# Altium schematic symbol library MCU_Microchip_ATmega.SchLib: 440 symbols (part 7 of 9)
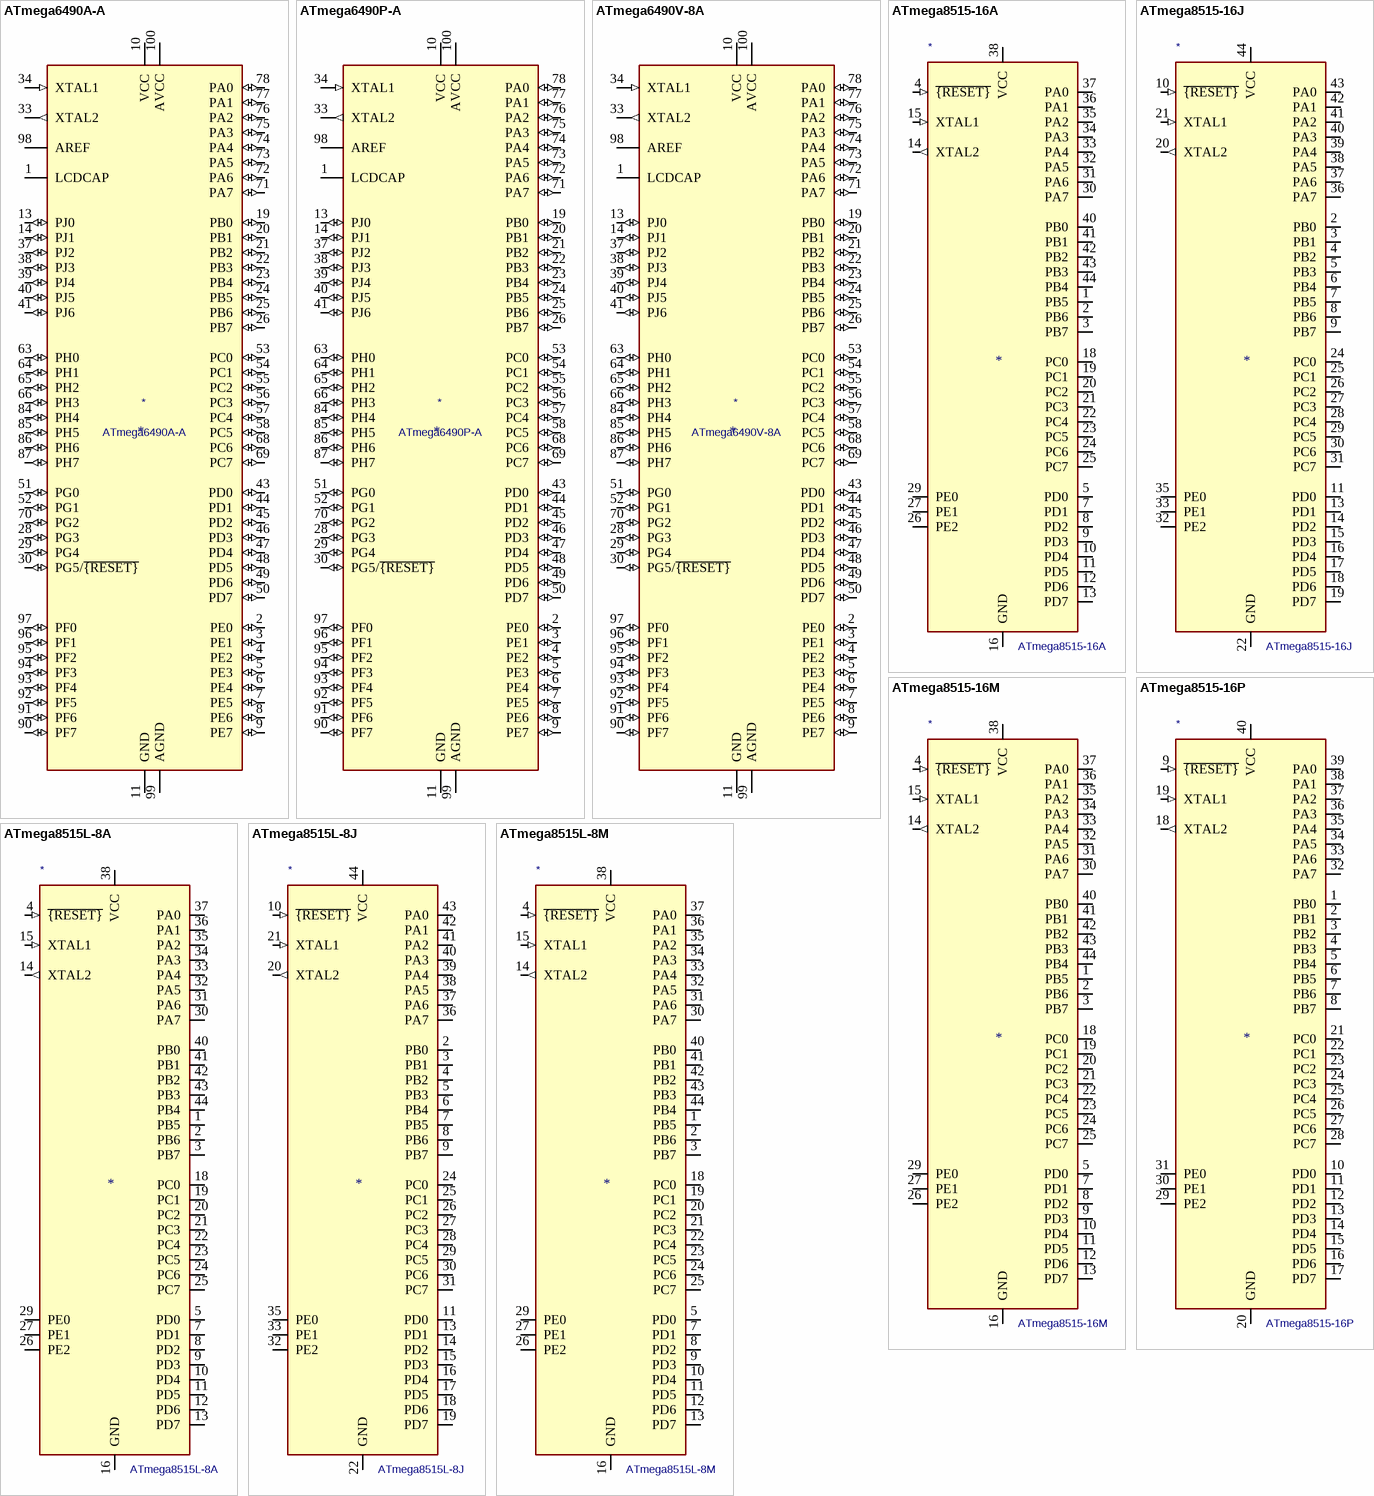
[diagram p46: symbols ATmega6490A-A to ATmega8515L-8M]

## ATmega6490A-A
designator *  value ATmega6490A-A
ki_keywords: AVR 8bit Microcontroller MegaAVR; ki_description: 20MHz, 64kB Flash, 4kB SRAM, 2kB EEPROM, JTAG, TQFP-100; ki_fp_filters: TQFP*14x14mm*P0.5mm*; Footprint: Package_QFP:TQFP-100_14x14mm_P0.5mm; Supplier: http://ww1.microchip.com/downloads/en/DeviceDoc/atmel-8284-8-bit-avr-microcontroller-atmega169a_pa_329a_pa_3290a_pa_649a_p_6490a_p_datasheet.pdf
footprint TQFP-100_14x14mm_P0.5mm
pins: 1 LCDCAP, 2 PE0 (io), 3 PE1 (io), 4 PE2 (io), 5 PE3 (io), 6 PE4 (io), 7 PE5 (io), 8 PE6 (io), 9 PE7 (io), 10 VCC (power), 11 GND (power), 12 NC (in) hidden, 13 PJ0 (io), 14 PJ1 (io), 15 NC (in) hidden, 16 NC (in) hidden, 17 NC (in) hidden, 18 NC (in) hidden, 19 PB0 (io), 20 PB1 (io), 21 PB2 (io), 22 PB3 (io), 23 PB4 (io), 24 PB5 (io), 25 PB6 (io), 26 PB7 (io), 27 NC (in) hidden, 28 PG3 (io), 29 PG4 (io), 30 PG5/~{{RESET}} (io), 31 VCC hidden, 32 GND hidden, 33 XTAL2 (out), 34 XTAL1 (in), 35 NC (in) hidden, 36 NC (in) hidden, 37 PJ2 (io), 38 PJ3 (io), 39 PJ4 (io), 40 PJ5 (io), 41 PJ6 (io), 42 NC (in) hidden, 43 PD0 (io), 44 PD1 (io), 45 PD2 (io), 46 PD3 (io), 47 PD4 (io), 48 PD5 (io), 49 PD6 (io), 50 PD7 (io), 51 PG0 (io), 52 PG1 (io), 53 PC0 (io), 54 PC1 (io), 55 PC2 (io), 56 PC3 (io), 57 PC4 (io), 58 PC5 (io), 59 NC (in) hidden, 60 NC (in) hidden, 61 NC (in) hidden, 62 NC (in) hidden, 63 PH0 (io), 64 PH1 (io), 65 PH2 (io), 66 PH3 (io), 67 NC (in) hidden, 68 PC6 (io), 69 PC7 (io), 70 PG2 (io), 71 PA7 (io), 72 PA6 (io), 73 PA5 (io), 74 PA4 (io), 75 PA3 (io), 76 PA2 (io), 77 PA1 (io), 78 PA0 (io), 79 NC (in) hidden, 80 VCC hidden, 81 GND hidden, 82 NC (in) hidden, 83 NC (in) hidden, 84 PH4 (io), 85 PH5 (io), 86 PH6 (io), 87 PH7 (io), 88 NC (in) hidden, 89 NC (in) hidden, 90 PF7 (io), 91 PF6 (io), 92 PF5 (io), 93 PF4 (io), 94 PF3 (io), 95 PF2 (io), 96 PF1 (io), 97 PF0 (io), 98 AREF, 99 AGND (power), 100 AVCC (power)

## ATmega6490P-A
designator *  value ATmega6490P-A
ki_keywords: AVR 8bit Microcontroller MegaAVR; ki_description: 20MHz, 64kB Flash, 4kB SRAM, 2kB EEPROM, JTAG, TQFP-100; ki_fp_filters: TQFP*14x14mm*P0.5mm*; Footprint: Package_QFP:TQFP-100_14x14mm_P0.5mm; Supplier: http://ww1.microchip.com/downloads/en/DeviceDoc/atmel-8284-8-bit-avr-microcontroller-atmega169a_pa_329a_pa_3290a_pa_649a_p_6490a_p_datasheet.pdf
footprint TQFP-100_14x14mm_P0.5mm
pins: 1 LCDCAP, 2 PE0 (io), 3 PE1 (io), 4 PE2 (io), 5 PE3 (io), 6 PE4 (io), 7 PE5 (io), 8 PE6 (io), 9 PE7 (io), 10 VCC (power), 11 GND (power), 12 NC (in) hidden, 13 PJ0 (io), 14 PJ1 (io), 15 NC (in) hidden, 16 NC (in) hidden, 17 NC (in) hidden, 18 NC (in) hidden, 19 PB0 (io), 20 PB1 (io), 21 PB2 (io), 22 PB3 (io), 23 PB4 (io), 24 PB5 (io), 25 PB6 (io), 26 PB7 (io), 27 NC (in) hidden, 28 PG3 (io), 29 PG4 (io), 30 PG5/~{{RESET}} (io), 31 VCC hidden, 32 GND hidden, 33 XTAL2 (out), 34 XTAL1 (in), 35 NC (in) hidden, 36 NC (in) hidden, 37 PJ2 (io), 38 PJ3 (io), 39 PJ4 (io), 40 PJ5 (io), 41 PJ6 (io), 42 NC (in) hidden, 43 PD0 (io), 44 PD1 (io), 45 PD2 (io), 46 PD3 (io), 47 PD4 (io), 48 PD5 (io), 49 PD6 (io), 50 PD7 (io), 51 PG0 (io), 52 PG1 (io), 53 PC0 (io), 54 PC1 (io), 55 PC2 (io), 56 PC3 (io), 57 PC4 (io), 58 PC5 (io), 59 NC (in) hidden, 60 NC (in) hidden, 61 NC (in) hidden, 62 NC (in) hidden, 63 PH0 (io), 64 PH1 (io), 65 PH2 (io), 66 PH3 (io), 67 NC (in) hidden, 68 PC6 (io), 69 PC7 (io), 70 PG2 (io), 71 PA7 (io), 72 PA6 (io), 73 PA5 (io), 74 PA4 (io), 75 PA3 (io), 76 PA2 (io), 77 PA1 (io), 78 PA0 (io), 79 NC (in) hidden, 80 VCC hidden, 81 GND hidden, 82 NC (in) hidden, 83 NC (in) hidden, 84 PH4 (io), 85 PH5 (io), 86 PH6 (io), 87 PH7 (io), 88 NC (in) hidden, 89 NC (in) hidden, 90 PF7 (io), 91 PF6 (io), 92 PF5 (io), 93 PF4 (io), 94 PF3 (io), 95 PF2 (io), 96 PF1 (io), 97 PF0 (io), 98 AREF, 99 AGND (power), 100 AVCC (power)

## ATmega6490V-8A
designator *  value ATmega6490V-8A
ki_keywords: AVR 8bit Microcontroller MegaAVR; ki_description: 8MHz, 64kB Flash, 4kB SRAM, 2kB EEPROM, JTAG, TQFP-100; ki_fp_filters: TQFP*14x14mm*P0.5mm*; Footprint: Package_QFP:TQFP-100_14x14mm_P0.5mm; Supplier: http://ww1.microchip.com/downloads/en/DeviceDoc/doc2552.pdf
footprint TQFP-100_14x14mm_P0.5mm
pins: 1 LCDCAP, 2 PE0 (io), 3 PE1 (io), 4 PE2 (io), 5 PE3 (io), 6 PE4 (io), 7 PE5 (io), 8 PE6 (io), 9 PE7 (io), 10 VCC (power), 11 GND (power), 12 NC (in) hidden, 13 PJ0 (io), 14 PJ1 (io), 15 NC (in) hidden, 16 NC (in) hidden, 17 NC (in) hidden, 18 NC (in) hidden, 19 PB0 (io), 20 PB1 (io), 21 PB2 (io), 22 PB3 (io), 23 PB4 (io), 24 PB5 (io), 25 PB6 (io), 26 PB7 (io), 27 NC (in) hidden, 28 PG3 (io), 29 PG4 (io), 30 PG5/~{{RESET}} (io), 31 VCC hidden, 32 GND hidden, 33 XTAL2 (out), 34 XTAL1 (in), 35 NC (in) hidden, 36 NC (in) hidden, 37 PJ2 (io), 38 PJ3 (io), 39 PJ4 (io), 40 PJ5 (io), 41 PJ6 (io), 42 NC (in) hidden, 43 PD0 (io), 44 PD1 (io), 45 PD2 (io), 46 PD3 (io), 47 PD4 (io), 48 PD5 (io), 49 PD6 (io), 50 PD7 (io), 51 PG0 (io), 52 PG1 (io), 53 PC0 (io), 54 PC1 (io), 55 PC2 (io), 56 PC3 (io), 57 PC4 (io), 58 PC5 (io), 59 NC (in) hidden, 60 NC (in) hidden, 61 NC (in) hidden, 62 NC (in) hidden, 63 PH0 (io), 64 PH1 (io), 65 PH2 (io), 66 PH3 (io), 67 NC (in) hidden, 68 PC6 (io), 69 PC7 (io), 70 PG2 (io), 71 PA7 (io), 72 PA6 (io), 73 PA5 (io), 74 PA4 (io), 75 PA3 (io), 76 PA2 (io), 77 PA1 (io), 78 PA0 (io), 79 NC (in) hidden, 80 VCC hidden, 81 GND hidden, 82 NC (in) hidden, 83 NC (in) hidden, 84 PH4 (io), 85 PH5 (io), 86 PH6 (io), 87 PH7 (io), 88 NC (in) hidden, 89 NC (in) hidden, 90 PF7 (io), 91 PF6 (io), 92 PF5 (io), 93 PF4 (io), 94 PF3 (io), 95 PF2 (io), 96 PF1 (io), 97 PF0 (io), 98 AREF, 99 AGND (power), 100 AVCC (power)

## ATmega8515-16A
designator *  value ATmega8515-16A
ki_keywords: AVR 8bit Microcontroller MegaAVR; ki_description: 16MHz, 8kB Flash, 512B SRAM, 512B EEPROM, TQFP-44; ki_fp_filters: TQFP*10x10mm*P0.8mm*; Footprint: Package_QFP:TQFP-44_10x10mm_P0.8mm; Supplier: http://ww1.microchip.com/downloads/en/DeviceDoc/doc2512.pdf
footprint TQFP-44_10x10mm_P0.8mm
pins: 1 PB5 (io), 2 PB6 (io), 3 PB7 (io), 4 ~{{RESET}} (in), 5 PD0 (io), 6 NC (in) hidden, 7 PD1 (io), 8 PD2 (io), 9 PD3 (io), 10 PD4 (io), 11 PD5 (io), 12 PD6 (io), 13 PD7 (io), 14 XTAL2 (out), 15 XTAL1 (in), 16 GND (power), 17 NC (in) hidden, 18 PC0 (io), 19 PC1 (io), 20 PC2 (io), 21 PC3 (io), 22 PC4 (io), 23 PC5 (io), 24 PC6 (io), 25 PC7 (io), 26 PE2 (io), 27 PE1 (io), 28 NC (in) hidden, 29 PE0 (io), 30 PA7 (io), 31 PA6 (io), 32 PA5 (io), 33 PA4 (io), 34 PA3 (io), 35 PA2 (io), 36 PA1 (io), 37 PA0 (io), 38 VCC (power), 39 NC (in) hidden, 40 PB0 (io), 41 PB1 (io), 42 PB2 (io), 43 PB3 (io), 44 PB4 (io)

## ATmega8515-16J
designator *  value ATmega8515-16J
ki_keywords: AVR 8bit Microcontroller MegaAVR; ki_description: 16MHz, 8kB Flash, 512B SRAM, 512B EEPROM, PLCC-44; ki_fp_filters: PLCC*; Footprint: Package_LCC:PLCC-44; Supplier: http://ww1.microchip.com/downloads/en/DeviceDoc/doc2512.pdf
footprint PLCC-44
pins: 1 NC (in) hidden, 2 PB0 (io), 3 PB1 (io), 4 PB2 (io), 5 PB3 (io), 6 PB4 (io), 7 PB5 (io), 8 PB6 (io), 9 PB7 (io), 10 ~{{RESET}} (in), 11 PD0 (io), 12 NC (in) hidden, 13 PD1 (io), 14 PD2 (io), 15 PD3 (io), 16 PD4 (io), 17 PD5 (io), 18 PD6 (io), 19 PD7 (io), 20 XTAL2 (out), 21 XTAL1 (in), 22 GND (power), 23 NC (in) hidden, 24 PC0 (io), 25 PC1 (io), 26 PC2 (io), 27 PC3 (io), 28 PC4 (io), 29 PC5 (io), 30 PC6 (io), 31 PC7 (io), 32 PE2 (io), 33 PE1 (io), 34 NC (in) hidden, 35 PE0 (io), 36 PA7 (io), 37 PA6 (io), 38 PA5 (io), 39 PA4 (io), 40 PA3 (io), 41 PA2 (io), 42 PA1 (io), 43 PA0 (io), 44 VCC (power)

## ATmega8515-16M
designator *  value ATmega8515-16M
ki_keywords: AVR 8bit Microcontroller MegaAVR; ki_description: 16MHz, 8kB Flash, 512B SRAM, 512B EEPROM, QFN-44; ki_fp_filters: QFN*1EP*7x7mm*P0.5mm*; Footprint: Package_DFN_QFN:QFN-44-1EP_7x7mm_P0.5mm_EP5.2x5.2mm; Supplier: http://ww1.microchip.com/downloads/en/DeviceDoc/doc2512.pdf
footprint QFN-44-1EP_7x7mm_P0.5mm_EP5.2x5.2mm
pins: 1 PB5 (io), 2 PB6 (io), 3 PB7 (io), 4 ~{{RESET}} (in), 5 PD0 (io), 6 NC (in) hidden, 7 PD1 (io), 8 PD2 (io), 9 PD3 (io), 10 PD4 (io), 11 PD5 (io), 12 PD6 (io), 13 PD7 (io), 14 XTAL2 (out), 15 XTAL1 (in), 16 GND (power), 17 NC (in) hidden, 18 PC0 (io), 19 PC1 (io), 20 PC2 (io), 21 PC3 (io), 22 PC4 (io), 23 PC5 (io), 24 PC6 (io), 25 PC7 (io), 26 PE2 (io), 27 PE1 (io), 28 NC (in) hidden, 29 PE0 (io), 30 PA7 (io), 31 PA6 (io), 32 PA5 (io), 33 PA4 (io), 34 PA3 (io), 35 PA2 (io), 36 PA1 (io), 37 PA0 (io), 38 VCC (power), 39 NC (in) hidden, 40 PB0 (io), 41 PB1 (io), 42 PB2 (io), 43 PB3 (io), 44 PB4 (io), 45 GND hidden

## ATmega8515-16P
designator *  value ATmega8515-16P
ki_keywords: AVR 8bit Microcontroller MegaAVR; ki_description: 16MHz, 8kB Flash, 512B SRAM, 512B EEPROM, DIP-40; ki_fp_filters: DIP*W15.24mm*; Footprint: Package_DIP:DIP-40_W15.24mm; Supplier: http://ww1.microchip.com/downloads/en/DeviceDoc/doc2512.pdf
footprint DIP-40_W15.24mm
pins: 1 PB0 (io), 2 PB1 (io), 3 PB2 (io), 4 PB3 (io), 5 PB4 (io), 6 PB5 (io), 7 PB6 (io), 8 PB7 (io), 9 ~{{RESET}} (in), 10 PD0 (io), 11 PD1 (io), 12 PD2 (io), 13 PD3 (io), 14 PD4 (io), 15 PD5 (io), 16 PD6 (io), 17 PD7 (io), 18 XTAL2 (out), 19 XTAL1 (in), 20 GND (power), 21 PC0 (io), 22 PC1 (io), 23 PC2 (io), 24 PC3 (io), 25 PC4 (io), 26 PC5 (io), 27 PC6 (io), 28 PC7 (io), 29 PE2 (io), 30 PE1 (io), 31 PE0 (io), 32 PA7 (io), 33 PA6 (io), 34 PA5 (io), 35 PA4 (io), 36 PA3 (io), 37 PA2 (io), 38 PA1 (io), 39 PA0 (io), 40 VCC (power)

## ATmega8515L-8A
designator *  value ATmega8515L-8A
ki_keywords: AVR 8bit Microcontroller MegaAVR; ki_description: 8MHz, 8kB Flash, 512B SRAM, 512B EEPROM, TQFP-44; ki_fp_filters: TQFP*10x10mm*P0.8mm*; Footprint: Package_QFP:TQFP-44_10x10mm_P0.8mm; Supplier: http://ww1.microchip.com/downloads/en/DeviceDoc/doc2512.pdf
footprint TQFP-44_10x10mm_P0.8mm
pins: 1 PB5 (io), 2 PB6 (io), 3 PB7 (io), 4 ~{{RESET}} (in), 5 PD0 (io), 6 NC (in) hidden, 7 PD1 (io), 8 PD2 (io), 9 PD3 (io), 10 PD4 (io), 11 PD5 (io), 12 PD6 (io), 13 PD7 (io), 14 XTAL2 (out), 15 XTAL1 (in), 16 GND (power), 17 NC (in) hidden, 18 PC0 (io), 19 PC1 (io), 20 PC2 (io), 21 PC3 (io), 22 PC4 (io), 23 PC5 (io), 24 PC6 (io), 25 PC7 (io), 26 PE2 (io), 27 PE1 (io), 28 NC (in) hidden, 29 PE0 (io), 30 PA7 (io), 31 PA6 (io), 32 PA5 (io), 33 PA4 (io), 34 PA3 (io), 35 PA2 (io), 36 PA1 (io), 37 PA0 (io), 38 VCC (power), 39 NC (in) hidden, 40 PB0 (io), 41 PB1 (io), 42 PB2 (io), 43 PB3 (io), 44 PB4 (io)

## ATmega8515L-8J
designator *  value ATmega8515L-8J
ki_keywords: AVR 8bit Microcontroller MegaAVR; ki_description: 8MHz, 8kB Flash, 512B SRAM, 512B EEPROM, PLCC-44; ki_fp_filters: PLCC*; Footprint: Package_LCC:PLCC-44; Supplier: http://ww1.microchip.com/downloads/en/DeviceDoc/doc2512.pdf
footprint PLCC-44
pins: 1 NC (in) hidden, 2 PB0 (io), 3 PB1 (io), 4 PB2 (io), 5 PB3 (io), 6 PB4 (io), 7 PB5 (io), 8 PB6 (io), 9 PB7 (io), 10 ~{{RESET}} (in), 11 PD0 (io), 12 NC (in) hidden, 13 PD1 (io), 14 PD2 (io), 15 PD3 (io), 16 PD4 (io), 17 PD5 (io), 18 PD6 (io), 19 PD7 (io), 20 XTAL2 (out), 21 XTAL1 (in), 22 GND (power), 23 NC (in) hidden, 24 PC0 (io), 25 PC1 (io), 26 PC2 (io), 27 PC3 (io), 28 PC4 (io), 29 PC5 (io), 30 PC6 (io), 31 PC7 (io), 32 PE2 (io), 33 PE1 (io), 34 NC (in) hidden, 35 PE0 (io), 36 PA7 (io), 37 PA6 (io), 38 PA5 (io), 39 PA4 (io), 40 PA3 (io), 41 PA2 (io), 42 PA1 (io), 43 PA0 (io), 44 VCC (power)

## ATmega8515L-8M
designator *  value ATmega8515L-8M
ki_keywords: AVR 8bit Microcontroller MegaAVR; ki_description: 8MHz, 8kB Flash, 512B SRAM, 512B EEPROM, QFN-44; ki_fp_filters: QFN*1EP*7x7mm*P0.5mm*; Footprint: Package_DFN_QFN:QFN-44-1EP_7x7mm_P0.5mm_EP5.2x5.2mm; Supplier: http://ww1.microchip.com/downloads/en/DeviceDoc/doc2512.pdf
footprint QFN-44-1EP_7x7mm_P0.5mm_EP5.2x5.2mm
pins: 1 PB5 (io), 2 PB6 (io), 3 PB7 (io), 4 ~{{RESET}} (in), 5 PD0 (io), 6 NC (in) hidden, 7 PD1 (io), 8 PD2 (io), 9 PD3 (io), 10 PD4 (io), 11 PD5 (io), 12 PD6 (io), 13 PD7 (io), 14 XTAL2 (out), 15 XTAL1 (in), 16 GND (power), 17 NC (in) hidden, 18 PC0 (io), 19 PC1 (io), 20 PC2 (io), 21 PC3 (io), 22 PC4 (io), 23 PC5 (io), 24 PC6 (io), 25 PC7 (io), 26 PE2 (io), 27 PE1 (io), 28 NC (in) hidden, 29 PE0 (io), 30 PA7 (io), 31 PA6 (io), 32 PA5 (io), 33 PA4 (io), 34 PA3 (io), 35 PA2 (io), 36 PA1 (io), 37 PA0 (io), 38 VCC (power), 39 NC (in) hidden, 40 PB0 (io), 41 PB1 (io), 42 PB2 (io), 43 PB3 (io), 44 PB4 (io), 45 GND hidden

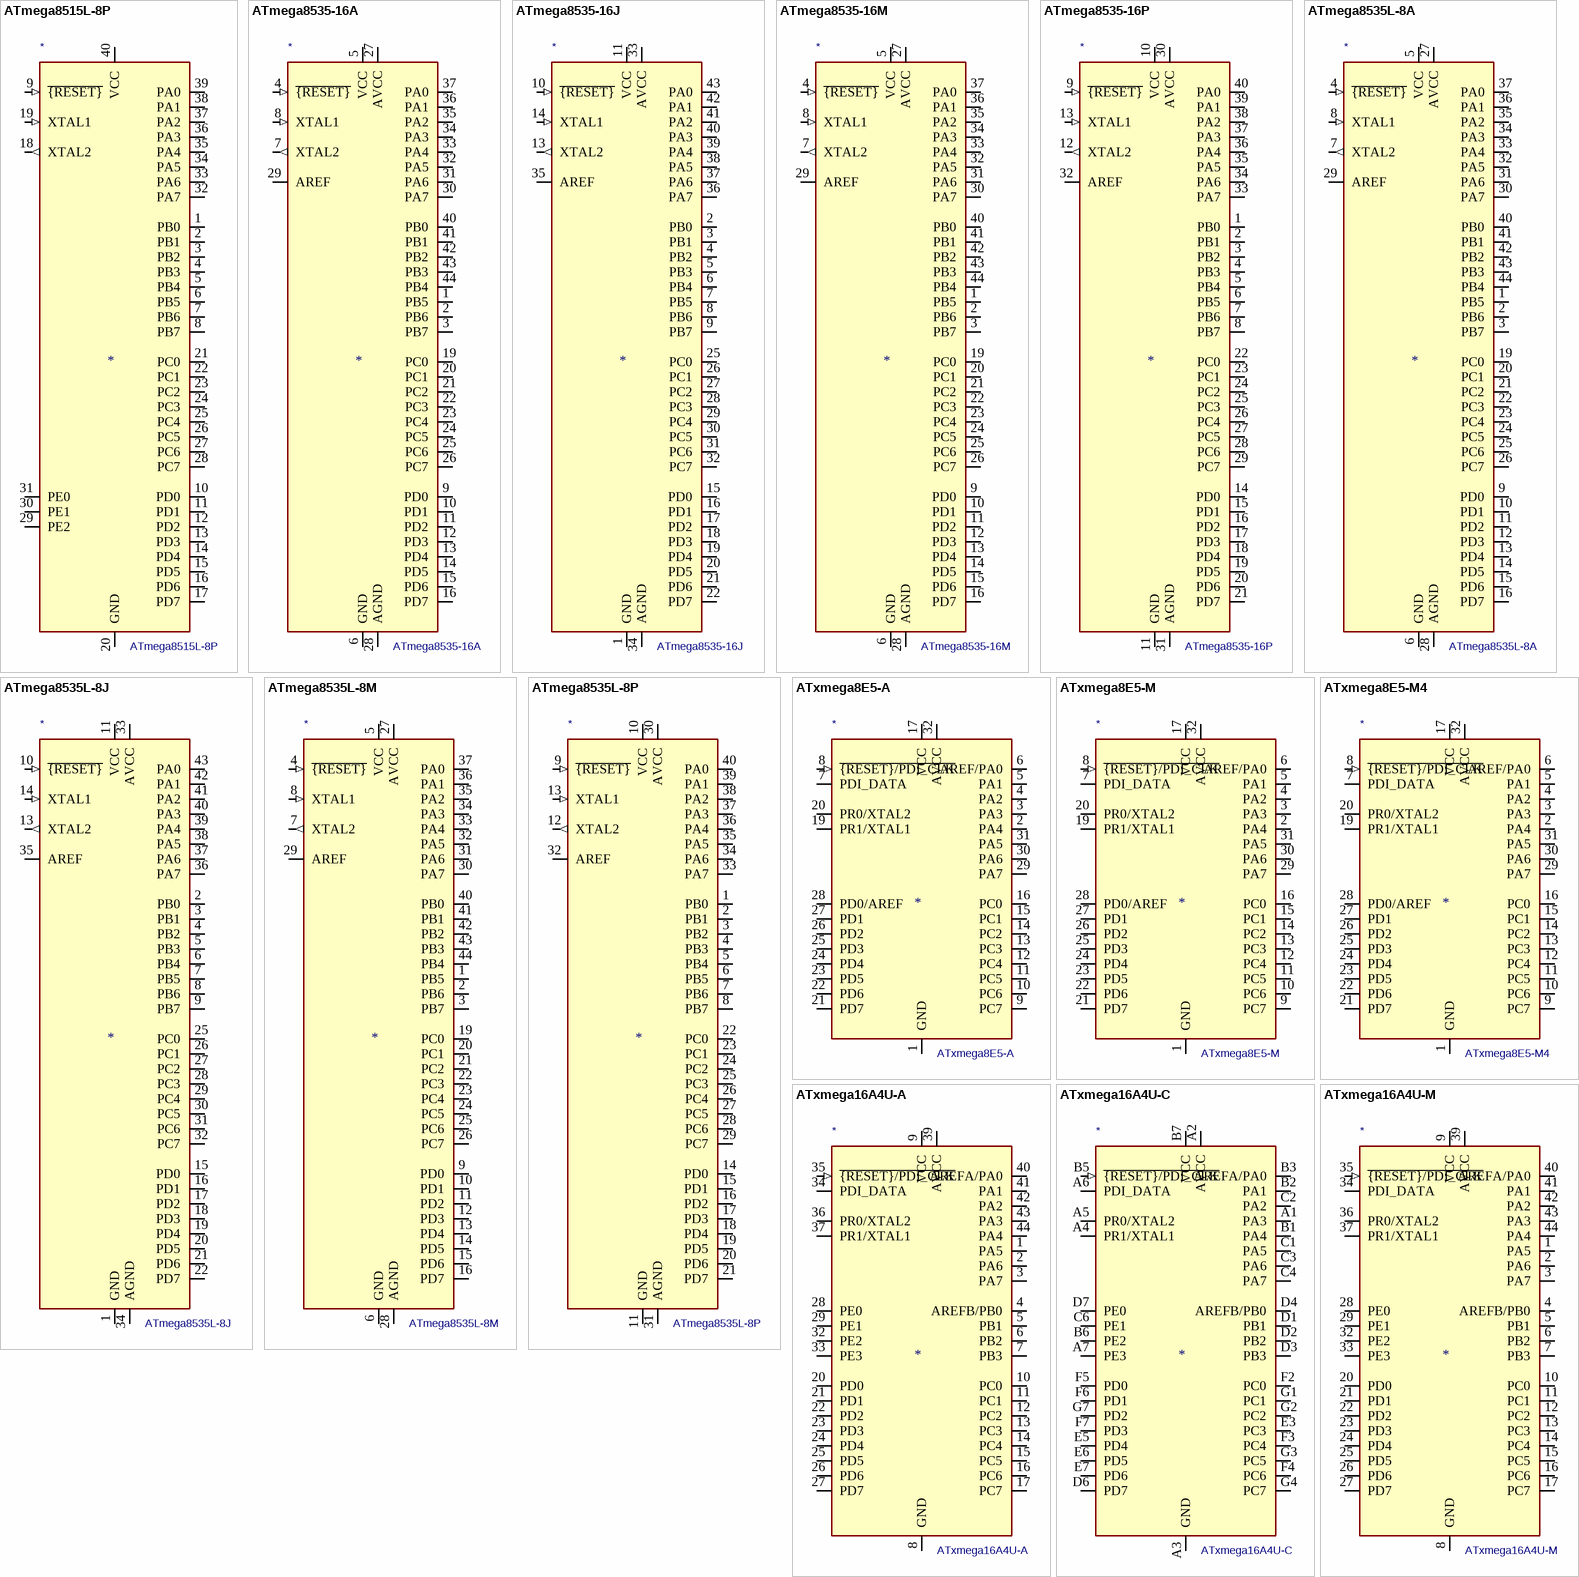
[diagram p30: symbols ATmega8515L-8P to ATxmega16A4U-M]

## ATmega8515L-8P
designator *  value ATmega8515L-8P
ki_keywords: AVR 8bit Microcontroller MegaAVR; ki_description: 8MHz, 8kB Flash, 512B SRAM, 512B EEPROM, DIP-40; ki_fp_filters: DIP*W15.24mm*; Footprint: Package_DIP:DIP-40_W15.24mm; Supplier: http://ww1.microchip.com/downloads/en/DeviceDoc/doc2512.pdf
footprint DIP-40_W15.24mm
pins: 1 PB0 (io), 2 PB1 (io), 3 PB2 (io), 4 PB3 (io), 5 PB4 (io), 6 PB5 (io), 7 PB6 (io), 8 PB7 (io), 9 ~{{RESET}} (in), 10 PD0 (io), 11 PD1 (io), 12 PD2 (io), 13 PD3 (io), 14 PD4 (io), 15 PD5 (io), 16 PD6 (io), 17 PD7 (io), 18 XTAL2 (out), 19 XTAL1 (in), 20 GND (power), 21 PC0 (io), 22 PC1 (io), 23 PC2 (io), 24 PC3 (io), 25 PC4 (io), 26 PC5 (io), 27 PC6 (io), 28 PC7 (io), 29 PE2 (io), 30 PE1 (io), 31 PE0 (io), 32 PA7 (io), 33 PA6 (io), 34 PA5 (io), 35 PA4 (io), 36 PA3 (io), 37 PA2 (io), 38 PA1 (io), 39 PA0 (io), 40 VCC (power)

## ATmega8535-16A
designator *  value ATmega8535-16A
ki_keywords: AVR 8bit Microcontroller MegaAVR; ki_description: 16MHz, 8kB Flash, 512B SRAM, 512B EEPROM, TQFP-44; ki_fp_filters: TQFP*10x10mm*P0.8mm*; Footprint: Package_QFP:TQFP-44_10x10mm_P0.8mm; Supplier: http://ww1.microchip.com/downloads/en/DeviceDoc/doc2502.pdf
footprint TQFP-44_10x10mm_P0.8mm
pins: 1 PB5 (io), 2 PB6 (io), 3 PB7 (io), 4 ~{{RESET}} (in), 5 VCC (power), 6 GND (power), 7 XTAL2 (out), 8 XTAL1 (in), 9 PD0 (io), 10 PD1 (io), 11 PD2 (io), 12 PD3 (io), 13 PD4 (io), 14 PD5 (io), 15 PD6 (io), 16 PD7 (io), 17 VCC hidden, 18 GND hidden, 19 PC0 (io), 20 PC1 (io), 21 PC2 (io), 22 PC3 (io), 23 PC4 (io), 24 PC5 (io), 25 PC6 (io), 26 PC7 (io), 27 AVCC (power), 28 AGND (power), 29 AREF, 30 PA7 (io), 31 PA6 (io), 32 PA5 (io), 33 PA4 (io), 34 PA3 (io), 35 PA2 (io), 36 PA1 (io), 37 PA0 (io), 38 VCC hidden, 39 GND hidden, 40 PB0 (io), 41 PB1 (io), 42 PB2 (io), 43 PB3 (io), 44 PB4 (io)

## ATmega8535-16J
designator *  value ATmega8535-16J
ki_keywords: AVR 8bit Microcontroller MegaAVR; ki_description: 16MHz, 8kB Flash, 512B SRAM, 512B EEPROM, PLCC-44; ki_fp_filters: PLCC*; Footprint: Package_LCC:PLCC-44; Supplier: http://ww1.microchip.com/downloads/en/DeviceDoc/doc2502.pdf
footprint PLCC-44
pins: 1 GND (power), 2 PB0 (io), 3 PB1 (io), 4 PB2 (io), 5 PB3 (io), 6 PB4 (io), 7 PB5 (io), 8 PB6 (io), 9 PB7 (io), 10 ~{{RESET}} (in), 11 VCC (power), 12 GND hidden, 13 XTAL2 (out), 14 XTAL1 (in), 15 PD0 (io), 16 PD1 (io), 17 PD2 (io), 18 PD3 (io), 19 PD4 (io), 20 PD5 (io), 21 PD6 (io), 22 PD7 (io), 23 VCC hidden, 24 GND hidden, 25 PC0 (io), 26 PC1 (io), 27 PC2 (io), 28 PC3 (io), 29 PC4 (io), 30 PC5 (io), 31 PC6 (io), 32 PC7 (io), 33 AVCC (power), 34 AGND (power), 35 AREF, 36 PA7 (io), 37 PA6 (io), 38 PA5 (io), 39 PA4 (io), 40 PA3 (io), 41 PA2 (io), 42 PA1 (io), 43 PA0 (io), 44 VCC hidden

## ATmega8535-16M
designator *  value ATmega8535-16M
ki_keywords: AVR 8bit Microcontroller MegaAVR; ki_description: 16MHz, 8kB Flash, 512B SRAM, 512B EEPROM, QFN-44; ki_fp_filters: QFN*1EP*7x7mm*P0.5mm*; Footprint: Package_DFN_QFN:QFN-44-1EP_7x7mm_P0.5mm_EP5.2x5.2mm; Supplier: http://ww1.microchip.com/downloads/en/DeviceDoc/doc2502.pdf
footprint QFN-44-1EP_7x7mm_P0.5mm_EP5.2x5.2mm
pins: 1 PB5 (io), 2 PB6 (io), 3 PB7 (io), 4 ~{{RESET}} (in), 5 VCC (power), 6 GND (power), 7 XTAL2 (out), 8 XTAL1 (in), 9 PD0 (io), 10 PD1 (io), 11 PD2 (io), 12 PD3 (io), 13 PD4 (io), 14 PD5 (io), 15 PD6 (io), 16 PD7 (io), 17 VCC hidden, 18 GND hidden, 19 PC0 (io), 20 PC1 (io), 21 PC2 (io), 22 PC3 (io), 23 PC4 (io), 24 PC5 (io), 25 PC6 (io), 26 PC7 (io), 27 AVCC (power), 28 AGND (power), 29 AREF, 30 PA7 (io), 31 PA6 (io), 32 PA5 (io), 33 PA4 (io), 34 PA3 (io), 35 PA2 (io), 36 PA1 (io), 37 PA0 (io), 38 VCC hidden, 39 GND hidden, 40 PB0 (io), 41 PB1 (io), 42 PB2 (io), 43 PB3 (io), 44 PB4 (io), 45 GND hidden

## ATmega8535-16P
designator *  value ATmega8535-16P
ki_keywords: AVR 8bit Microcontroller MegaAVR; ki_description: 16MHz, 8kB Flash, 512B SRAM, 512B EEPROM, DIP-40; ki_fp_filters: DIP*W15.24mm*; Footprint: Package_DIP:DIP-40_W15.24mm; Supplier: http://ww1.microchip.com/downloads/en/DeviceDoc/doc2502.pdf
footprint DIP-40_W15.24mm
pins: 1 PB0 (io), 2 PB1 (io), 3 PB2 (io), 4 PB3 (io), 5 PB4 (io), 6 PB5 (io), 7 PB6 (io), 8 PB7 (io), 9 ~{{RESET}} (in), 10 VCC (power), 11 GND (power), 12 XTAL2 (out), 13 XTAL1 (in), 14 PD0 (io), 15 PD1 (io), 16 PD2 (io), 17 PD3 (io), 18 PD4 (io), 19 PD5 (io), 20 PD6 (io), 21 PD7 (io), 22 PC0 (io), 23 PC1 (io), 24 PC2 (io), 25 PC3 (io), 26 PC4 (io), 27 PC5 (io), 28 PC6 (io), 29 PC7 (io), 30 AVCC (power), 31 AGND (power), 32 AREF, 33 PA7 (io), 34 PA6 (io), 35 PA5 (io), 36 PA4 (io), 37 PA3 (io), 38 PA2 (io), 39 PA1 (io), 40 PA0 (io)

## ATmega8535L-8A
designator *  value ATmega8535L-8A
ki_keywords: AVR 8bit Microcontroller MegaAVR; ki_description: 8MHz, 8kB Flash, 512B SRAM, 512B EEPROM, TQFP-44; ki_fp_filters: TQFP*10x10mm*P0.8mm*; Footprint: Package_QFP:TQFP-44_10x10mm_P0.8mm; Supplier: http://ww1.microchip.com/downloads/en/DeviceDoc/doc2502.pdf
footprint TQFP-44_10x10mm_P0.8mm
pins: 1 PB5 (io), 2 PB6 (io), 3 PB7 (io), 4 ~{{RESET}} (in), 5 VCC (power), 6 GND (power), 7 XTAL2 (out), 8 XTAL1 (in), 9 PD0 (io), 10 PD1 (io), 11 PD2 (io), 12 PD3 (io), 13 PD4 (io), 14 PD5 (io), 15 PD6 (io), 16 PD7 (io), 17 VCC hidden, 18 GND hidden, 19 PC0 (io), 20 PC1 (io), 21 PC2 (io), 22 PC3 (io), 23 PC4 (io), 24 PC5 (io), 25 PC6 (io), 26 PC7 (io), 27 AVCC (power), 28 AGND (power), 29 AREF, 30 PA7 (io), 31 PA6 (io), 32 PA5 (io), 33 PA4 (io), 34 PA3 (io), 35 PA2 (io), 36 PA1 (io), 37 PA0 (io), 38 VCC hidden, 39 GND hidden, 40 PB0 (io), 41 PB1 (io), 42 PB2 (io), 43 PB3 (io), 44 PB4 (io)

## ATmega8535L-8J
designator *  value ATmega8535L-8J
ki_keywords: AVR 8bit Microcontroller MegaAVR; ki_description: 8MHz, 8kB Flash, 512B SRAM, 512B EEPROM, PLCC-44; ki_fp_filters: PLCC*; Footprint: Package_LCC:PLCC-44; Supplier: http://ww1.microchip.com/downloads/en/DeviceDoc/doc2502.pdf
footprint PLCC-44
pins: 1 GND (power), 2 PB0 (io), 3 PB1 (io), 4 PB2 (io), 5 PB3 (io), 6 PB4 (io), 7 PB5 (io), 8 PB6 (io), 9 PB7 (io), 10 ~{{RESET}} (in), 11 VCC (power), 12 GND hidden, 13 XTAL2 (out), 14 XTAL1 (in), 15 PD0 (io), 16 PD1 (io), 17 PD2 (io), 18 PD3 (io), 19 PD4 (io), 20 PD5 (io), 21 PD6 (io), 22 PD7 (io), 23 VCC hidden, 24 GND hidden, 25 PC0 (io), 26 PC1 (io), 27 PC2 (io), 28 PC3 (io), 29 PC4 (io), 30 PC5 (io), 31 PC6 (io), 32 PC7 (io), 33 AVCC (power), 34 AGND (power), 35 AREF, 36 PA7 (io), 37 PA6 (io), 38 PA5 (io), 39 PA4 (io), 40 PA3 (io), 41 PA2 (io), 42 PA1 (io), 43 PA0 (io), 44 VCC hidden

## ATmega8535L-8M
designator *  value ATmega8535L-8M
ki_keywords: AVR 8bit Microcontroller MegaAVR; ki_description: 8MHz, 8kB Flash, 512B SRAM, 512B EEPROM, QFN-44; ki_fp_filters: QFN*1EP*7x7mm*P0.5mm*; Footprint: Package_DFN_QFN:QFN-44-1EP_7x7mm_P0.5mm_EP5.2x5.2mm; Supplier: http://ww1.microchip.com/downloads/en/DeviceDoc/doc2502.pdf
footprint QFN-44-1EP_7x7mm_P0.5mm_EP5.2x5.2mm
pins: 1 PB5 (io), 2 PB6 (io), 3 PB7 (io), 4 ~{{RESET}} (in), 5 VCC (power), 6 GND (power), 7 XTAL2 (out), 8 XTAL1 (in), 9 PD0 (io), 10 PD1 (io), 11 PD2 (io), 12 PD3 (io), 13 PD4 (io), 14 PD5 (io), 15 PD6 (io), 16 PD7 (io), 17 VCC hidden, 18 GND hidden, 19 PC0 (io), 20 PC1 (io), 21 PC2 (io), 22 PC3 (io), 23 PC4 (io), 24 PC5 (io), 25 PC6 (io), 26 PC7 (io), 27 AVCC (power), 28 AGND (power), 29 AREF, 30 PA7 (io), 31 PA6 (io), 32 PA5 (io), 33 PA4 (io), 34 PA3 (io), 35 PA2 (io), 36 PA1 (io), 37 PA0 (io), 38 VCC hidden, 39 GND hidden, 40 PB0 (io), 41 PB1 (io), 42 PB2 (io), 43 PB3 (io), 44 PB4 (io), 45 GND hidden

## ATmega8535L-8P
designator *  value ATmega8535L-8P
ki_keywords: AVR 8bit Microcontroller MegaAVR; ki_description: 8MHz, 8kB Flash, 512B SRAM, 512B EEPROM, DIP-40; ki_fp_filters: DIP*W15.24mm*; Footprint: Package_DIP:DIP-40_W15.24mm; Supplier: http://ww1.microchip.com/downloads/en/DeviceDoc/doc2502.pdf
footprint DIP-40_W15.24mm
pins: 1 PB0 (io), 2 PB1 (io), 3 PB2 (io), 4 PB3 (io), 5 PB4 (io), 6 PB5 (io), 7 PB6 (io), 8 PB7 (io), 9 ~{{RESET}} (in), 10 VCC (power), 11 GND (power), 12 XTAL2 (out), 13 XTAL1 (in), 14 PD0 (io), 15 PD1 (io), 16 PD2 (io), 17 PD3 (io), 18 PD4 (io), 19 PD5 (io), 20 PD6 (io), 21 PD7 (io), 22 PC0 (io), 23 PC1 (io), 24 PC2 (io), 25 PC3 (io), 26 PC4 (io), 27 PC5 (io), 28 PC6 (io), 29 PC7 (io), 30 AVCC (power), 31 AGND (power), 32 AREF, 33 PA7 (io), 34 PA6 (io), 35 PA5 (io), 36 PA4 (io), 37 PA3 (io), 38 PA2 (io), 39 PA1 (io), 40 PA0 (io)

## ATxmega8E5-A
designator *  value ATxmega8E5-A
ki_keywords: AVR 8/16bit Microcontroller XMegaAVR; ki_description: 32MHz, 8kB Flash, 2kB Boot, 1kB SRAM, 512B EEPROM, TQFP-32; ki_fp_filters: TQFP*7x7mm*P0.8mm*; Footprint: Package_QFP:TQFP-32_7x7mm_P0.8mm; Supplier: http://ww1.microchip.com/downloads/en/DeviceDoc/Atmel-8153-8-and-16-bit-AVR-Microcontroller-XMEGA-E-ATxmega8E5-ATxmega16E5-ATxmega32E5_Datasheet.pdf
footprint TQFP-32_7x7mm_P0.8mm
pins: 1 GND (power), 2 PA4 (io), 3 PA3 (io), 4 PA2 (io), 5 PA1 (io), 6 AREF/PA0 (io), 7 PDI_DATA (io), 8 ~{{RESET}/PDI_CLK} (in), 9 PC7 (io), 10 PC6 (io), 11 PC5 (io), 12 PC4 (io), 13 PC3 (io), 14 PC2 (io), 15 PC1 (io), 16 PC0 (io), 17 VCC (power), 18 GND hidden, 19 PR1/XTAL1 (io), 20 PR0/XTAL2 (io), 21 PD7 (io), 22 PD6 (io), 23 PD5 (io), 24 PD4 (io), 25 PD3 (io), 26 PD2 (io), 27 PD1 (io), 28 PD0/AREF (io), 29 PA7 (io), 30 PA6 (io), 31 PA5 (io), 32 AVCC (power)

## ATxmega8E5-M
designator *  value ATxmega8E5-M
ki_keywords: AVR 8/16bit Microcontroller XMegaAVR; ki_description: 32MHz, 8kB Flash, 2kB Boot, 1kB SRAM, 512B EEPROM, QFN-32; ki_fp_filters: QFN*1EP*5x5mm*P0.5mm*; Footprint: Package_DFN_QFN:QFN-32-1EP_5x5mm_P0.5mm_EP3.1x3.1mm; Supplier: http://ww1.microchip.com/downloads/en/DeviceDoc/Atmel-8153-8-and-16-bit-AVR-Microcontroller-XMEGA-E-ATxmega8E5-ATxmega16E5-ATxmega32E5_Datasheet.pdf
footprint QFN-32-1EP_5x5mm_P0.5mm_EP3.1x3.1mm
pins: 1 GND (power), 2 PA4 (io), 3 PA3 (io), 4 PA2 (io), 5 PA1 (io), 6 AREF/PA0 (io), 7 PDI_DATA (io), 8 ~{{RESET}/PDI_CLK} (in), 9 PC7 (io), 10 PC6 (io), 11 PC5 (io), 12 PC4 (io), 13 PC3 (io), 14 PC2 (io), 15 PC1 (io), 16 PC0 (io), 17 VCC (power), 18 GND hidden, 19 PR1/XTAL1 (io), 20 PR0/XTAL2 (io), 21 PD7 (io), 22 PD6 (io), 23 PD5 (io), 24 PD4 (io), 25 PD3 (io), 26 PD2 (io), 27 PD1 (io), 28 PD0/AREF (io), 29 PA7 (io), 30 PA6 (io), 31 PA5 (io), 32 AVCC (power), 33 GND hidden

## ATxmega8E5-M4
designator *  value ATxmega8E5-M4
ki_keywords: AVR 8/16bit Microcontroller XMegaAVR; ki_description: 32MHz, 8kB Flash, 2kB Boot, 1kB SRAM, 512B EEPROM, QFN-32; ki_fp_filters: QFN*1EP*4x4mm*P0.4mm*; Footprint: Package_DFN_QFN:QFN-32-1EP_4x4mm_P0.4mm_EP2.9x2.9mm; Supplier: http://ww1.microchip.com/downloads/en/DeviceDoc/Atmel-8153-8-and-16-bit-AVR-Microcontroller-XMEGA-E-ATxmega8E5-ATxmega16E5-ATxmega32E5_Datasheet.pdf
footprint QFN-32-1EP_4x4mm_P0.4mm_EP2.9x2.9mm
pins: 1 GND (power), 2 PA4 (io), 3 PA3 (io), 4 PA2 (io), 5 PA1 (io), 6 AREF/PA0 (io), 7 PDI_DATA (io), 8 ~{{RESET}/PDI_CLK} (in), 9 PC7 (io), 10 PC6 (io), 11 PC5 (io), 12 PC4 (io), 13 PC3 (io), 14 PC2 (io), 15 PC1 (io), 16 PC0 (io), 17 VCC (power), 18 GND hidden, 19 PR1/XTAL1 (io), 20 PR0/XTAL2 (io), 21 PD7 (io), 22 PD6 (io), 23 PD5 (io), 24 PD4 (io), 25 PD3 (io), 26 PD2 (io), 27 PD1 (io), 28 PD0/AREF (io), 29 PA7 (io), 30 PA6 (io), 31 PA5 (io), 32 AVCC (power), 33 GND hidden

## ATxmega16A4U-A
designator *  value ATxmega16A4U-A
ki_keywords: AVR 8/16bit Microcontroller XMegaAVR; ki_description: 32MHz, 16kB Flash, 4kB Boot, 2kB SRAM, 1kB EEPROM, JTAG, USB, TQFP-44; ki_fp_filters: TQFP*10x10mm*P0.8mm*; Footprint: Package_QFP:TQFP-44_10x10mm_P0.8mm; Supplier: http://ww1.microchip.com/downloads/en/DeviceDoc/Atmel-8387-8-and16-bit-AVR-Microcontroller-XMEGA-A4U_Datasheet.pdf
footprint TQFP-44_10x10mm_P0.8mm
pins: 1 PA5 (io), 2 PA6 (io), 3 PA7 (io), 4 AREFB/PB0 (io), 5 PB1 (io), 6 PB2 (io), 7 PB3 (io), 8 GND (power), 9 VCC (power), 10 PC0 (io), 11 PC1 (io), 12 PC2 (io), 13 PC3 (io), 14 PC4 (io), 15 PC5 (io), 16 PC6 (io), 17 PC7 (io), 18 GND hidden, 19 VCC hidden, 20 PD0 (io), 21 PD1 (io), 22 PD2 (io), 23 PD3 (io), 24 PD4 (io), 25 PD5 (io), 26 PD6 (io), 27 PD7 (io), 28 PE0 (io), 29 PE1 (io), 30 GND hidden, 31 VCC hidden, 32 PE2 (io), 33 PE3 (io), 34 PDI_DATA (io), 35 ~{{RESET}/PDI_CLK} (in), 36 PR0/XTAL2 (io), 37 PR1/XTAL1 (io), 38 GND hidden, 39 AVCC (power), 40 AREFA/PA0 (io), 41 PA1 (io), 42 PA2 (io), 43 PA3 (io), 44 PA4 (io)

## ATxmega16A4U-C
designator *  value ATxmega16A4U-C
ki_keywords: AVR 8/16bit Microcontroller XMegaAVR; ki_description: 32MHz, 16kB Flash, 4kB Boot, 2kB SRAM, 1kB EEPROM, JTAG, USB, VFBGA-49; ki_fp_filters: VFBGA*5.0x5.0mm*Layout7x7*P0.65mm*; Footprint: Package_BGA:VFBGA-49_5.0x5.0mm_Layout7x7_P0.65mm; Supplier: http://ww1.microchip.com/downloads/en/DeviceDoc/Atmel-8387-8-and16-bit-AVR-Microcontroller-XMEGA-A4U_Datasheet.pdf
footprint VFBGA-49_5.0x5.0mm_Layout7x7_P0.65mm
pins: A1 PA3 (io), A2 AVCC (power), A3 GND (power), A4 PR1/XTAL1 (io), A5 PR0/XTAL2 (io), A6 PDI_DATA (io), A7 PE3 (io), B1 PA4 (io), B2 PA1 (io), B3 AREFA/PA0 (io), B4 GND hidden, B5 ~{{RESET}/PDI_CLK} (in), B6 PE2 (io), B7 VCC (power), C1 PA5 (io), C2 PA2 (io), C3 PA6 (io), C4 PA7 (io), C5 GND hidden, C6 PE1 (io), C7 GND hidden, D1 PB1 (io), D2 PB2 (io), D3 PB3 (io), D4 AREFB/PB0 (io), D5 GND hidden, D6 PD7 (io), D7 PE0 (io), E1 GND hidden, E2 GND hidden, E3 PC3 (io), E4 GND hidden, E5 PD4 (io), E6 PD5 (io), E7 PD6 (io), F1 VCC hidden, F2 PC0 (io), F3 PC4 (io), F4 PC6 (io), F5 PD0 (io), F6 PD1 (io), F7 PD3 (io), G1 PC1 (io), G2 PC2 (io), G3 PC5 (io), G4 PC7 (io), G5 GND hidden, G6 VCC hidden, G7 PD2 (io)

## ATxmega16A4U-M
designator *  value ATxmega16A4U-M
ki_keywords: AVR 8/16bit Microcontroller XMegaAVR; ki_description: 32MHz, 16kB Flash, 4kB Boot, 2kB SRAM, 1kB EEPROM, JTAG, USB, QFN-44; ki_fp_filters: QFN*1EP*7x7mm*P0.5mm*; Footprint: Package_DFN_QFN:QFN-44-1EP_7x7mm_P0.5mm_EP5.2x5.2mm; Supplier: http://ww1.microchip.com/downloads/en/DeviceDoc/Atmel-8387-8-and16-bit-AVR-Microcontroller-XMEGA-A4U_Datasheet.pdf
footprint QFN-44-1EP_7x7mm_P0.5mm_EP5.2x5.2mm
pins: 1 PA5 (io), 2 PA6 (io), 3 PA7 (io), 4 AREFB/PB0 (io), 5 PB1 (io), 6 PB2 (io), 7 PB3 (io), 8 GND (power), 9 VCC (power), 10 PC0 (io), 11 PC1 (io), 12 PC2 (io), 13 PC3 (io), 14 PC4 (io), 15 PC5 (io), 16 PC6 (io), 17 PC7 (io), 18 GND hidden, 19 VCC hidden, 20 PD0 (io), 21 PD1 (io), 22 PD2 (io), 23 PD3 (io), 24 PD4 (io), 25 PD5 (io), 26 PD6 (io), 27 PD7 (io), 28 PE0 (io), 29 PE1 (io), 30 GND hidden, 31 VCC hidden, 32 PE2 (io), 33 PE3 (io), 34 PDI_DATA (io), 35 ~{{RESET}/PDI_CLK} (in), 36 PR0/XTAL2 (io), 37 PR1/XTAL1 (io), 38 GND hidden, 39 AVCC (power), 40 AREFA/PA0 (io), 41 PA1 (io), 42 PA2 (io), 43 PA3 (io), 44 PA4 (io), 45 GND hidden
